# Altium footprint library микроконтроллеры.PcbLib: 22 footprints (part 2 of 2)
Each footprint in its own frame and in the unit in brackets; x right, y up, seen from the top. Pads: shape width x height; smd on the part's side, far side on the other; paste and mask are expansions set on the pad; w line width, h text height; cw(c..) or ccw(c..) is an arc to the next point about the centre after c.
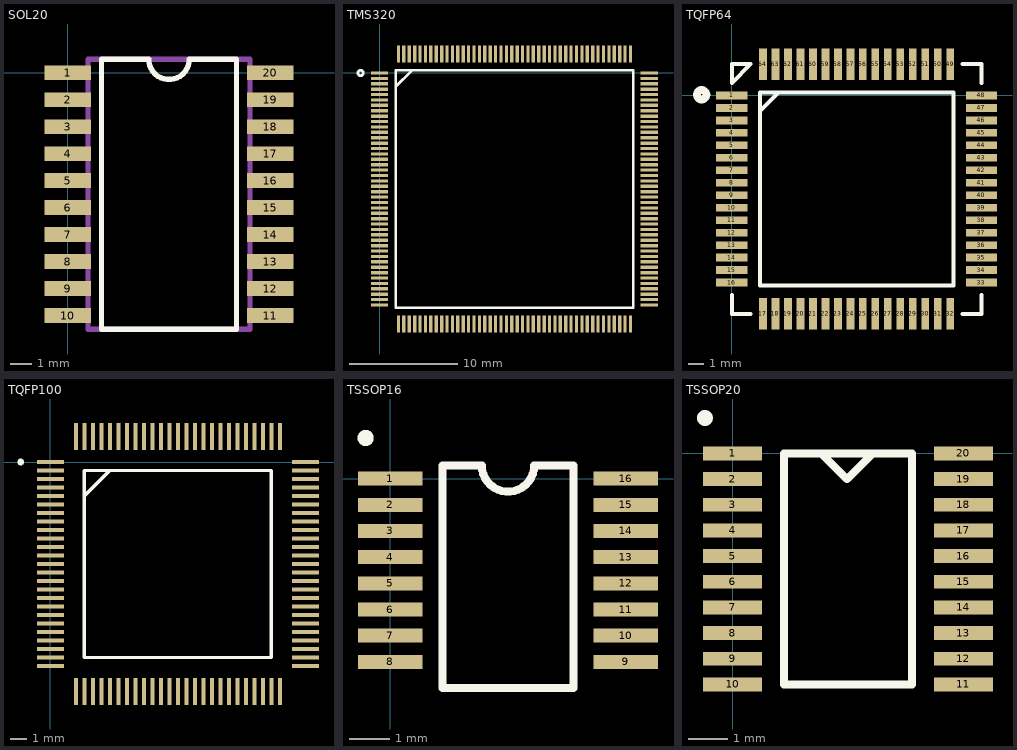
[diagram p1: the footprints below, top view; thin cyan lines are the x and y axes]

## SOL20 [mm]
pads (20):
  rect 2.2x0.7 smd: 1(0,0) 2(0,-1.27) 3(0,-2.54) 4(0,-3.81) 5(0,-5.08) 6(0,-6.35) 7(0,-7.62) 8(0,-8.89) 9(0,-10.16) 10(0,-11.43) 11(9.525,-11.43) 12(9.525,-10.16) 13(9.525,-8.89) 14(9.525,-7.62) 15(9.525,-6.35) 16(9.525,-5.08) 17(9.525,-3.81) 18(9.525,-2.54) 19(9.525,-1.27) 20(9.525,0)
Top Overlay:
  lines w0.25: 3.81,0.635 1.587,0.635 1.587,-12.065 7.938,-12.065 7.938,0.635 5.715,0.635
  lines w0.254: 3.81,0.635 ccw(c4.763,0.635) 5.715,0.635
Mechanical 10:
  lines w0.25: 0.953,-12.065 8.572,-12.065 8.572,0.635 0.953,0.635 0.953,-12.065

## TMS320 [mm]
pads (176):
  rect 1.6x0.3 smd: 1(0,0) 2(0,-0.5) 3(0,-1) 4(0,-1.5) 5(0,-2) 6(0,-2.5) 7(0,-3) 8(0,-3.5) 9(0,-4) 10(0,-4.5) 11(0,-5) 12(0,-5.5) 13(0,-6) 14(0,-6.5) 15(0,-7) 16(0,-7.5) 17(0,-8) 18(0,-8.5) 19(0,-9) 20(0,-9.5) 21(0,-10) 22(0,-10.5) 23(0,-11) 24(0,-11.5) 25(0,-12) 26(0,-12.5) 27(0,-13) 28(0,-13.5) 29(0,-14) 30(0,-14.5) 31(0,-15) 32(0,-15.5) 33(0,-16) 34(0,-16.5) 35(0,-17) 36(0,-17.5) 37(0,-18) 38(0,-18.5) 39(0,-19) 40(0,-19.5) 41(0,-20) 42(0,-20.5) 43(0,-21) 44(0,-21.5) 89(25,-21.5) 90(25,-21) 91(25,-20.5) 92(25,-20) 93(25,-19.5) 94(25,-19) 95(25,-18.5) 96(25,-18) 97(25,-17.5) 98(25,-17) 99(25,-16.5) 100(25,-16) 101(25,-15.5) 102(25,-15) 103(25,-14.5) 104(25,-14) 105(25,-13.5) 106(25,-13) 107(25,-12.5) 108(25,-12) 109(25,-11.5) 110(25,-11) 111(25,-10.5) 112(25,-10) 113(25,-9.5) 114(25,-9) 115(25,-8.5) 116(25,-8) 117(25,-7.5) 118(25,-7) 119(25,-6.5) 120(25,-6) 121(25,-5.5) 122(25,-5) 123(25,-4.5) 124(25,-4) 125(25,-3.5) 126(25,-3) 127(25,-2.5) 128(25,-2) 129(25,-1.5) 130(25,-1) 131(25,-0.5) 132(25,0)
  rect 0.3x1.6 smd: 45(1.75,-23.25) 46(2.25,-23.25) 47(2.75,-23.25) 48(3.25,-23.25) 49(3.75,-23.25) 50(4.25,-23.25) 51(4.75,-23.25) 52(5.25,-23.25) 53(5.75,-23.25) 54(6.25,-23.25) 55(6.75,-23.25) 56(7.25,-23.25) 57(7.75,-23.25) 58(8.25,-23.25) 59(8.75,-23.25) 60(9.25,-23.25) 61(9.75,-23.25) 62(10.25,-23.25) 63(10.75,-23.25) 64(11.25,-23.25) 65(11.75,-23.25) 66(12.25,-23.25) 67(12.75,-23.25) 68(13.25,-23.25) 69(13.75,-23.25) 70(14.25,-23.25) 71(14.75,-23.25) 72(15.25,-23.25) 73(15.75,-23.25) 74(16.25,-23.25) 75(16.75,-23.25) 76(17.25,-23.25) 77(17.75,-23.25) 78(18.25,-23.25) 79(18.75,-23.25) 80(19.25,-23.25) 81(19.75,-23.25) 82(20.25,-23.25) 83(20.75,-23.25) 84(21.25,-23.25) 85(21.75,-23.25) 86(22.25,-23.25) 87(22.75,-23.25) 88(23.25,-23.25) 133(23.25,1.75) 134(22.75,1.75) 135(22.25,1.75) 136(21.75,1.75) 137(21.25,1.75) 138(20.75,1.75) 139(20.25,1.75) 140(19.75,1.75) 141(19.25,1.75) 142(18.75,1.75) 143(18.25,1.75) 144(17.75,1.75) 145(17.25,1.75) 146(16.75,1.75) 147(16.25,1.75) 148(15.75,1.75) 149(15.25,1.75) 150(14.75,1.75) 151(14.25,1.75) 152(13.75,1.75) 153(13.25,1.75) 154(12.75,1.75) 155(12.25,1.75) 156(11.75,1.75) 157(11.25,1.75) 158(10.75,1.75) 159(10.25,1.75) 160(9.75,1.75) 161(9.25,1.75) 162(8.75,1.75) 163(8.25,1.75) 164(7.75,1.75) 165(7.25,1.75) 166(6.75,1.75) 167(6.25,1.75) 168(5.75,1.75) 169(5.25,1.75) 170(4.75,1.75) 171(4.25,1.75) 172(3.75,1.75) 173(3.25,1.75) 174(2.75,1.75) 175(2.25,1.75) 176(1.75,1.75)
Top Overlay:
  circle w0.25: c-1.75,0 r0.25
  lines w0.254: 1.5,-1.25 3,0.25 ; 1.5,-21.75 23.5,-21.75 23.5,0.25 1.5,0.25 1.5,-21.75

## TQFP64 [mm]
pads (64):
  rect 2x0.5 smd: 1(0,0) 2(0,-0.8) 3(0,-1.6) 4(0,-2.4) 5(0,-3.2) 6(0,-4) 7(0,-4.8) 8(0,-5.6) 9(0,-6.4) 10(0,-7.2) 11(0,-8) 12(0,-8.8) 13(0,-9.6) 14(0,-10.4) 15(0,-11.2) 16(0,-12) 33(16,-12) 34(16,-11.2) 35(16,-10.4) 36(16,-9.6) 37(16,-8.8) 38(16,-8) 39(16,-7.2) 40(16,-6.4) 41(16,-5.6) 42(16,-4.8) 43(16,-4) 44(16,-3.2) 45(16,-2.4) 46(16,-1.6) 47(16,-0.8) 48(16,0)
  rect 0.5x2 smd: 17(2,-14) 18(2.8,-14) 19(3.6,-14) 20(4.4,-14) 21(5.2,-14) 22(6,-14) 23(6.8,-14) 24(7.6,-14) 25(8.4,-14) 26(9.2,-14) 27(10,-14) 28(10.8,-14) 29(11.6,-14) 30(12.4,-14) 31(13.2,-14) 32(14,-14) 49(14,2) 50(13.2,2) 51(12.4,2) 52(11.6,2) 53(10.8,2) 54(10,2) 55(9.2,2) 56(8.4,2) 57(7.6,2) 58(6.8,2) 59(6,2) 60(5.2,2) 61(4.4,2) 62(3.6,2) 63(2.8,2) 64(2,2)
Top Overlay:
  circle w0.5: c-1.93,0.04 r0.3
  lines w0.254: 0,-12.8 0,-14 1.2,-14 ; 1.8,-1 3,0.2 ; 14.8,-14 16,-14 16,-12.8 ; 14.8,2 16,2 16,0.8 ; 0,0.8 0,2 1.2,2 0,0.8 ; 1.8,-12.2 14.2,-12.2 14.2,0.2 1.8,0.2 1.8,-12.2

## TQFP100 [mm]
pads (100):
  rect 1.6x0.25 smd mask+0.025: 1(0,0) 2(0,-0.5) 3(0,-1) 4(0,-1.5) 5(0,-2) 6(0,-2.5) 7(0,-3) 8(0,-3.5) 9(0,-4) 10(0,-4.5) 11(0,-5) 12(0,-5.5) 13(0,-6) 14(0,-6.5) 15(0,-7) 16(0,-7.5) 17(0,-8) 18(0,-8.5) 19(0,-9) 20(0,-9.5) 21(0,-10) 22(0,-10.5) 23(0,-11) 24(0,-11.5) 25(0,-12) 51(15,-12) 52(15,-11.5) 53(15,-11) 54(15,-10.5) 55(15,-10) 56(15,-9.5) 57(15,-9) 58(15,-8.5) 59(15,-8) 60(15,-7.5) 61(15,-7) 62(15,-6.5) 63(15,-6) 64(15,-5.5) 65(15,-5) 66(15,-4.5) 67(15,-4) 68(15,-3.5) 69(15,-3) 70(15,-2.5) 71(15,-2) 72(15,-1.5) 73(15,-1) 74(15,-0.5) 75(15,0)
  rect 0.25x1.6 smd mask+0.025: 26(1.5,-13.5) 27(2,-13.5) 28(2.5,-13.5) 29(3,-13.5) 30(3.5,-13.5) 31(4,-13.5) 32(4.5,-13.5) 33(5,-13.5) 34(5.5,-13.5) 35(6,-13.5) 36(6.5,-13.5) 37(7,-13.5) 38(7.5,-13.5) 39(8,-13.5) 40(8.5,-13.5) 41(9,-13.5) 42(9.5,-13.5) 43(10,-13.5) 44(10.5,-13.5) 45(11,-13.5) 46(11.5,-13.5) 47(12,-13.5) 48(12.5,-13.5) 49(13,-13.5) 50(13.5,-13.5) 76(13.5,1.5) 77(13,1.5) 78(12.5,1.5) 79(12,1.5) 80(11.5,1.5) 81(11,1.5) 82(10.5,1.5) 83(10,1.5) 84(9.5,1.5) 85(9,1.5) 86(8.5,1.5) 87(8,1.5) 88(7.5,1.5) 89(7,1.5) 90(6.5,1.5) 91(6,1.5) 92(5.5,1.5) 93(5,1.5) 94(4.5,1.5) 95(4,1.5) 96(3.5,1.5) 97(3,1.5) 98(2.5,1.5) 99(2,1.5) 100(1.5,1.5)
Top Overlay:
  circle w0.2: c-1.75,0 r0.1
  lines w0.2: 2,-2 3.5,-0.5 ; 2,-11.5 2,-0.5 13,-0.5 13,-11.5 2,-11.5
3D body "User Library-P-LQFP100-14x14-0_50.SLDPRT": height 2, standoff 0, extent -0.6,-14.1 15.6,2.1

## TSSOP16 [mm]
pads (16):
  rect 1.6x0.35 smd mask+0.025: 1(0,0) 2(0,-0.65) 3(0,-1.3) 4(0,-1.95) 5(0,-2.6) 6(0,-3.25) 7(0,-3.9) 8(0,-4.55) 9(5.85,-4.55) 10(5.85,-3.9) 11(5.85,-3.25) 12(5.85,-2.6) 13(5.85,-1.95) 14(5.85,-1.3) 15(5.85,-0.65) 16(5.85,0)
Top Overlay:
  circle w0.2: c-0.61,1.01 r0.1
  lines w0.2: 1.3,-5.2 4.55,-5.2 4.55,0.325 3.575,0.325 cw(c2.925,0.325) 2.275,0.325 1.3,0.325 1.3,-5.2
3D body "User Library-TSSOP-16-1.SLDPRT": height 1.1, standoff 0, extent -0.275,-4.775 6.125,0.225

## TSSOP20 [mm]
pads (20):
  rect 1.5x0.35 smd mask+0.025: 1(0,0) 2(0,-0.65) 3(0,-1.3) 4(0,-1.95) 5(0,-2.6) 6(0,-3.25) 7(0,-3.9) 8(0,-4.55) 9(0,-5.2) 10(0,-5.85) 11(5.85,-5.85) 12(5.85,-5.2) 13(5.85,-4.55) 14(5.85,-3.9) 15(5.85,-3.25) 16(5.85,-2.6) 17(5.85,-1.95) 18(5.85,-1.3) 19(5.85,-0.65) 20(5.85,0)
Top Overlay:
  circle w0.2: c-0.7,0.9 r0.1
  lines w0.2: 2.25,0 2.9,-0.65 3.55,0 ; 1.3,-5.85 1.3,0 4.55,0 4.55,-5.85 1.3,-5.85
3D body "User Library-TSSOP-20.SLDPRT": height 1.2, standoff 0, extent -0.35,-6.225 6.2,0.375